# Altium footprint library Discretes.PcbLib: 81 footprints (part 3 of 6)
Each footprint in its own frame and in the unit in brackets; x right, y up, seen from the top. Pads: shape width x height; smd on the part's side, far side on the other; paste and mask are expansions set on the pad; w line width, h text height; cw(c..) or ccw(c..) is an arc to the next point about the centre after c.
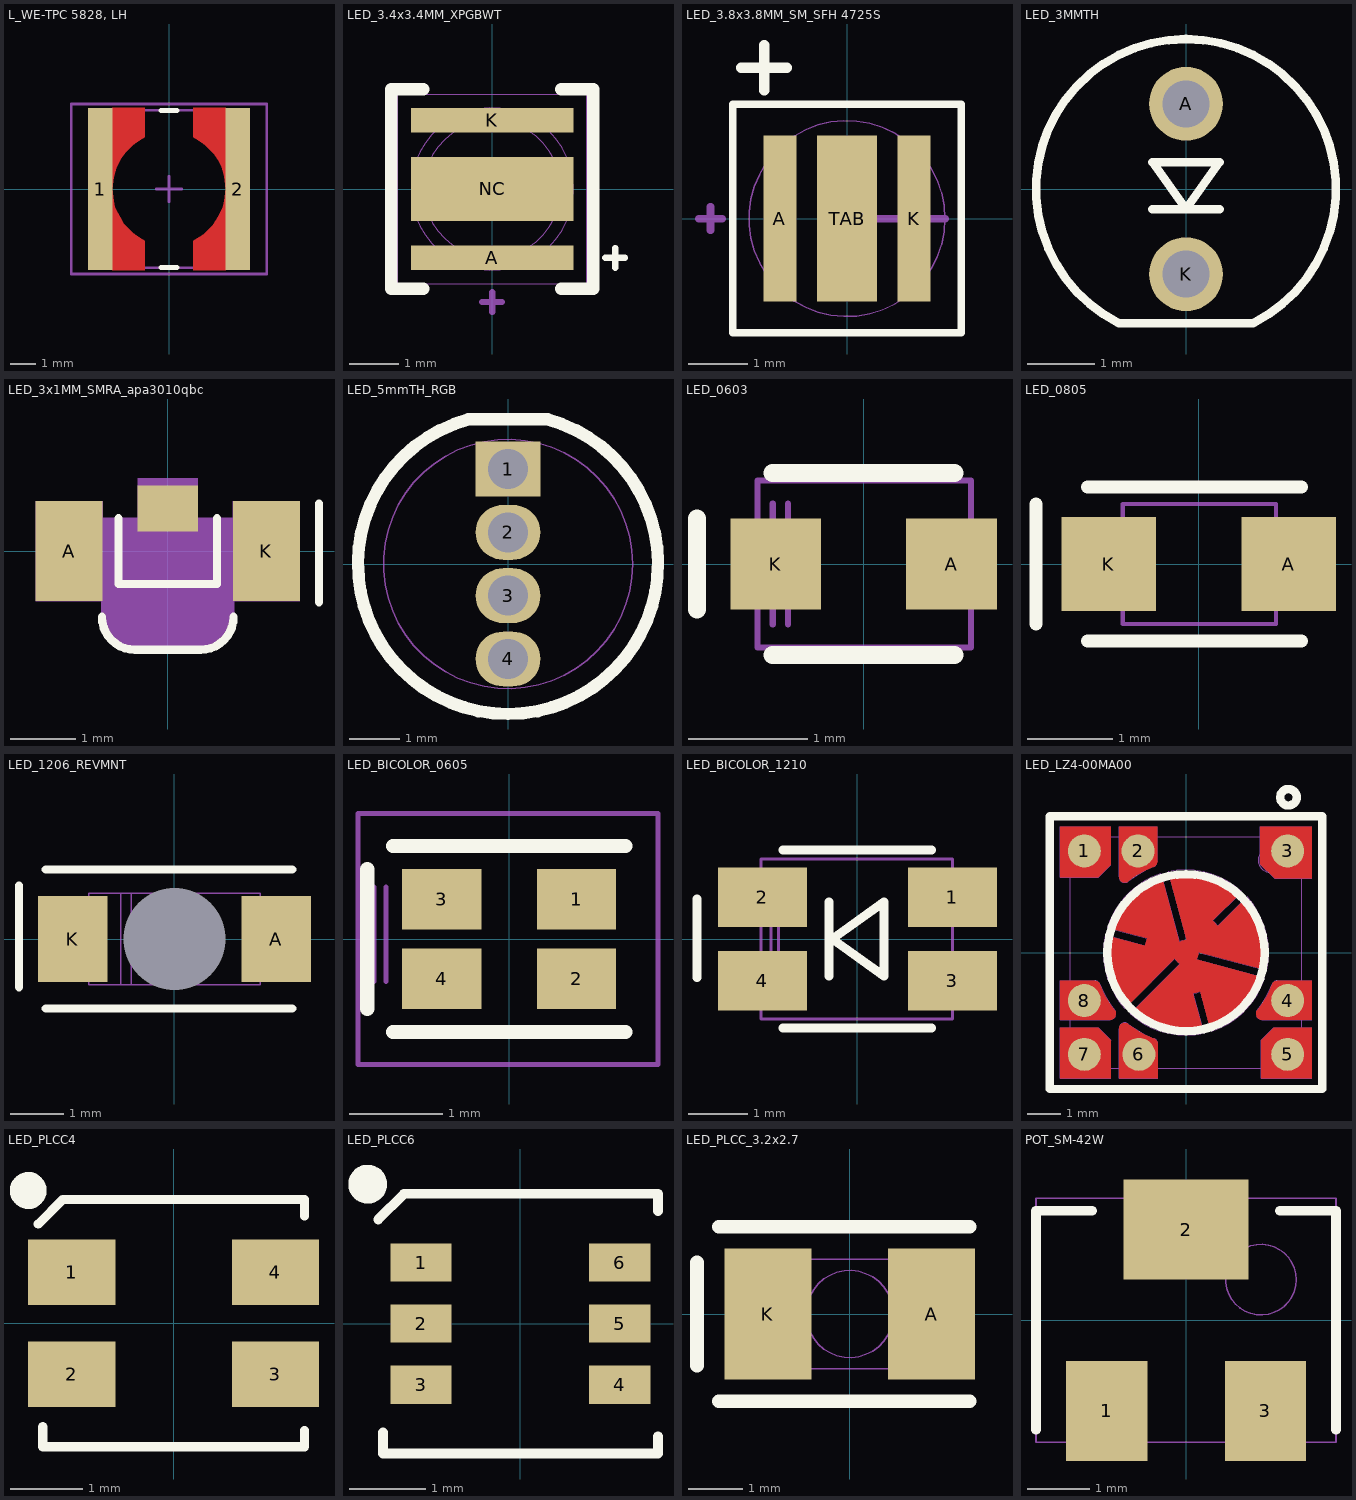
[diagram p2: the footprints below, top view; thin cyan lines are the x and y axes]

## L_WE-TPC 5828, LH [mm] "SMD Inductor, 2-Leads, Body 5,8x5,8mm"
height 3
pads (2):
  rect 0.95x6.3 smd: 1(-2.675,0) 2(2.675,0)
Top Layer:
  region: -2.2,3.15 -0.95,3.15 -0.95,2 -1.2,1.85 -1.4,1.7 -1.7,1.4 -1.85,1.2 -2.05,0.8 -2.15,0.45 -2.2,0
  region: 2.2,3.15 0.95,3.15 0.95,2 1.2,1.85 1.4,1.7 1.75,1.35 1.95,1.05 2.05,0.85 2.15,0.5 2.2,0
  region: 2.2,-3.15 0.95,-3.15 0.95,-2 1.35,-1.75 1.6,-1.5 1.7,-1.4 1.9,-1.1 2.05,-0.8 2.1,-0.65 2.15,-0.45 2.2,0
  region: -2.2,-3.15 -0.95,-3.15 -0.95,-2 -1.2,-1.85 -1.4,-1.7 -1.75,-1.35 -1.9,-1.1 -2.1,-0.7 -2.15,-0.45 -2.2,0
Top Overlay:
  lines w0.2: -0.3,-3.05 0.3,-3.05 ; -0.3,3.05 0.3,3.05
Mechanical 1:
  text ".Designator" at -1,-0.3 h1
Mechanical 13:
  lines w0.1: -3.05,-3.05 -3.05,3.05 3.05,3.05 3.05,-3.05 -3.05,-3.05
Mechanical 15:
  lines w0.1: -0.5,0 0.5,0 ; 0,-0.5 0,0.5 ; -3.8,-3.3 -3.8,3.3 3.8,3.3 3.8,-3.3 -3.8,-3.3
3D body "744053680.stp": height 2.79, standoff -0.01, extent -2.9,-2.9 2.9,2.9

## LED_3.4x3.4MM_XPGBWT [mm] "Cree Xlamp XPG2 Series LED footprint"
height 2.36
pads (3):
  rect 3.3x0.5 smd: A(0,-1.4) K(0,1.4)
  rect 3.3x1.3 smd: NC(0,0)
Top Overlay:
  lines w0.127: 2.3,-1.4 2.7,-1.4 ; 2.5,-1.6 2.5,-1.2
  lines w0.254: -1.4,-2.032 -2.057,-2.032 -2.057,2.032 -1.4,2.032 ; 1.4,-2.032 2.057,-2.032 2.057,2.032 1.4,2.032
Mechanical 1:
  circle w0.025: c0,0 r1.651
  circle w0.025: c0,0 r1.397
  lines w0.025: 1.925,1.925 -1.925,1.925 -1.925,-1.925 -1.925,-1.925 1.925,-1.925 1.925,-1.925 1.925,1.925 ; 1.925,1.925 1.925,1.925
  lines w0.127: -0.2,-2.3 0.2,-2.3 ; 0,-2.5 0,-2.1
  text ".Designator" at -1.9,2.2 h1
3D body "XLamp_XPG2_3D_STEP.stp": height 2.36, standoff 0, extent -1.725,-1.725 1.725,1.725

## LED_3.8x3.8MM_SM_SFH 4725S [mil] "Oslon 9401nm IR LED"
height 100
pads (3):
  rect 22x110 smd: A(-44.5,0) K(44.5,0)
  rect 40x110 smd: TAB(0,0)
Top Overlay:
  lines w5: 75.8,75.8 -75.78,75.8 -75.79,-75.77 75.77,-75.77 75.79,-75.79 75.79,75.79 ; 75.79,75.79 75.8,75.8
  lines w7: -70,100 -40,100 ; -55,85 -55,115
Top Paste:
  pour cut-out: 17,-6 -17,-6 -17,-51 17,-51
  pour cut-out: -37,51 -52.5,51 -52.5,-51 -37,-51
  pour cut-out: 37,-51 52.5,-51 52.5,51 37,51
  pour cut-out: -17,6 17,6 17,51 -17,51
Mechanical 1:
  circle w1: c0,0 r65
  circle w5: c0,0 r10
  lines w1: 75.78,75.8 -75.78,75.8 -75.79,-75.77 -75.78,-75.78 75.78,-75.78 75.79,-75.77 75.79,75.79 ; 75.78,75.8 75.79,75.79
  lines w5: -98.43,0 -82.68,0 ; -90.55,-7.87 -90.55,7.87 ; 10,0 65,0
  text ".Designator" at -45,15 h35
3D body "OslonSFH4725.step": height 94.53, standoff 0, extent -75.78,-75.78 75.8,75.8

## LED_3MMTH [mm] "LED, 3MM TH"
height 1.1
pads (2):
  round 1.1 hole 0.7: A(0,1.27) K(0,-1.27)
Top Overlay:
  lines w0.127: -0.5,-0.3 0.5,-0.3 ; -1,-2 cw(c0,0) 1,-2 -1,-2 ; -0.5,0.4 0.5,0.4 0,-0.3 -0.5,0.4
Mechanical 1:
  text ".Designator" at -0.6,2.7 h1.5

## LED_3x1MM_SMRA_apa3010qbc [mil] "LED right angle"
height 40
pads (3):
  rect 36x27.56 smd: " "(0,25.59)
  rect 40x60 smd: A(-59.06,0) K(59.05,0)
Top Overlay:
  lines w5: -39.37,-39.37 ccw(c-19.69,-39.37) -19.69,-59.06 19.68,-59.06 ccw(c19.68,-39.37) 39.37,-39.37 ; -29.53,19.68 -29.53,-19.69 29.52,-19.69 29.52,19.68 ; 90.55,-30.52 90.55,28.54
Mechanical 1:
  pour cut-out: -4.92,-29.53 -4.92,-19.69 4.92,-19.69 4.92,-29.53
  lines w1: -39.37,-19.69 -39.37,-39.37 ccw(c-19.69,-39.37) -19.69,-59.06 19.68,-59.06 ccw(c19.68,-39.37) 39.37,-39.37 39.37,-19.69 ; -59.06,-19.69 -59.06,19.68 59.05,19.68 59.05,-19.69 -59.06,-19.69
  text ".Designator" at -35.43,51.18 h39.37
Mechanical 11:
  pour cut-out: 18.03,19.68 38.89,19.68 38.89,30 79.05,30 79.05,-30 39.37,-30 39.37,-39.57 39.28,-41.28 39.04,-42.98 38.66,-44.65 38.13,-46.28 37.46,-47.86 36.66,-49.37 35.72,-50.81 34.67,-52.16 33.5,-53.42 32.23,-54.56 30.86,-55.6 29.41,-56.51 27.88,-57.29 26.29,-57.93 24.65,-58.43 22.98,-58.79 21.28,-59 19.72,-59.06 -19.92,-59.06 -21.63,-58.98 -23.32,-58.74 -24.98,-58.36 -26.61,-57.84 -28.18,-57.18 -29.69,-56.38 -31.13,-55.45 -32.47,-54.41 -33.73,-53.25 -34.87,-51.98 -35.9,-50.62 -36.81,-49.17 -37.59,-47.65 -38.23,-46.07 -38.74,-44.44 -39.1,-42.77 -39.31,-41.08 -39.37,-39.49 -39.37,-30 -79.06,-30 -79.06,30 -38.9,30 -38.9,19.68 -18.03,19.68 -18.03,43.62 18.03,43.62
3D body "90deg led.STEP": height 39.37, standoff 0, extent -59.05,-59.05 59.06,19.69

## LED_5mmTH_RGB [mm] "LED RGB, 5mm, Round, Through Hole"
height 1.1
pads (4):
  rect 1.3x1.1 hole 0.8: 1(0,1.905)
  oval 1.3x1.1 hole 0.8: 2(0,0.635) 3(0,-0.635) 4(0,-1.905)
Top Overlay:
  lines w0.25: -0.8,2.9 ccw(c0,0) 0.8,2.9 -0.8,2.9
Mechanical 1:
  circle w0.025: c0,0 r2.5
  circle w0.025: c0,0 r2.95
  text ".Designator" at -1.1,3.4 h1.5

## LED_0603 [mil] "LED Footprint 0603"
height 29.53
pads (2):
  rect 30x30 smd: A(29,0) K(-29,0)
Top Overlay:
  lines w6: -55,-15 -55,15 ; -30,-30 30,-30 ; -30,30 30,30
Mechanical 1:
  lines w2: -30,-20 -30,20 ; -25,-20 -25,20 ; 35.43,-27.56 -35,-27.56 -35,27.56 35.43,27.56
  lines w2.01: 35.43,-27.56 35.43,27.56
  text ".Designator" at -27.56,35.43 h39.37
3D body "APT1608.STEP": height 29.53, standoff 0, extent -31.88,-15.74 31.54,15.75

## LED_0805 [mm] "LED Footprint 0805"
height 0.75
pads (2):
  rect 1.1x1.1 smd: A(1.05,0) K(-1.05,0)
Top Overlay:
  lines w0.152: -1.9,-0.7 -1.9,0.7 ; -1.3,-0.9 1.2,-0.9 ; -1.3,0.9 1.2,0.9
Mechanical 1:
  lines w0.051: -0.762,-0.508 -0.762,0.508 ; -0.635,-0.508 -0.635,0.508 ; -0.889,-0.7 0.9,-0.7 0.9,0.7 -0.889,0.7 -0.889,-0.7
  text ".Designator" at -0.4,3.175 h1
3D body "LED SMD0805.step": height 0.85, standoff 0.01, extent -1.031,-0.453 1.031,0.453

## LED_1206_REVMNT [mm] "LED Footprint 1206 Reverse Mount"
height 1.1
pads (3):
  round 0 hole 1.9 unplated: 1(0,0)
  rect 1.3x1.6 smd: A(1.9,0) K(-1.9,0)
Top Overlay:
  lines w0.152: -2.9,-0.9 -2.9,1 ; -2.4,-1.3 2.2,-1.3 ; -2.4,1.3 2.2,1.3
Mechanical 1:
  lines w0.025: -1,0.85 -1,-0.85 -0.8,-0.85 -0.8,0.85 ; -1.6,-0.85 -1.6,0.85 1.6,0.85 1.6,-0.85 -1.6,-0.85
  text ".Designator" at -1.325,1.5 h1.52

## LED_BICOLOR_0605 [mm] "LED Footprint bi-color 0605"
height 0.75
pads (4):
  rect 0.85x0.65 smd mask+0.06: 1(0.725,0.425) 2(0.725,-0.425) 3(-0.725,0.425) 4(-0.725,-0.425)
Top Overlay:
  lines w0.152: -1.525,-0.75 -1.525,0.75 ; -1.25,-1 1.25,-1 ; -1.25,1 1.25,1
Mechanical 1:
  lines w0.051: -1.452,-0.458 -1.452,0.558 ; -1.325,-0.458 -1.325,0.558 ; -1.625,-1.35 -1.625,1.35 1.6,1.35 1.6,-1.35 -1.625,-1.35
  text ".Designator" at -0.4,3.175 h1

## LED_BICOLOR_1210 [mm] "LED Footprint bi-color 1210 style"
height 0.75
pads (4):
  rect 1.5x1 smd: 1(1.6,0.7) 2(-1.6,0.7) 3(1.6,-0.7) 4(-1.6,-0.7)
Top Overlay:
  lines w0.152: -2.7,-0.65 -2.7,0.675 ; -1.25,-1.5 1.25,-1.5 ; -1.25,1.5 1.25,1.5 ; -0.475,-0.625 -0.475,0.625 ; -0.425,0 0.45,-0.625 0.45,0 0.45,0.625 -0.425,0
Mechanical 1:
  lines w0.051: -1.452,-0.458 -1.452,0.558 ; -1.325,-0.458 -1.325,0.558 ; -1.625,-1.35 -1.625,1.35 1.6,1.35 1.6,-1.35 -1.625,-1.35
  text ".Designator" at -0.4,3.175 h1
3D body "APB3227.STEP": height 1.1, standoff 0, extent -1.6,-1.35 1.6,1.35

## LED_LZ4-00MA00 [mm]
height 4.2
pads (8):
  round 1 smd paste-1 mask+0: 1(-3.075,3.075) 2(-1.45,3.075) 3(3.075,3.075) 4(3.075,-1.45) 5(3.075,-3.075) 6(-1.425,-3.075) 7(-3.075,-3.075) 8(-3.075,-1.45)
Top Layer:
  region: 2.275,-3.8 3.8,-3.8 3.8,-2.275 2.654,-2.275 2.275,-2.654
  region: 2.679,2.25 2.25,2.679 2.25,3.8 3.8,3.8 3.8,2.25
  region: -3.8,2.275 -2.654,2.275 -2.275,2.654 -2.275,3.8 -3.8,3.8
  region: -3.8,-3.8 -2.275,-3.8 -2.275,-2.654 -2.654,-2.275 -3.8,-2.275
  region: -1.753,-1.591 -0.333,-0.172 -0.32,-0.197 -0.286,-0.245 -0.245,-0.286 -0.197,-0.32 -0.172,-0.333 -1.591,-1.753 -1.487,-1.848 -1.258,-2.012 -1.011,-2.147 -0.749,-2.252 -0.477,-2.325 -0.198,-2.365 0.083,-2.372 0.364,-2.344 0.502,-2.314 0.212,-1.232 0.24,-1.227 0.296,-1.215 0.351,-1.2 0.406,-1.183 0.433,-1.173 0.723,-2.255 0.857,-2.212 1.114,-2.096 1.354,-1.949 1.576,-1.775 1.775,-1.576 1.949,-1.354 2.096,-1.113 2.212,-0.857 2.255,-0.723 0.315,-0.203 0.331,-0.179 0.355,-0.125 0.37,-0.069 0.376,-0.011 0.375,0.018 2.314,-0.502 2.344,-0.364 2.372,-0.083 2.365,0.198 2.325,0.477 2.252,0.749 2.147,1.011 2.012,1.258 1.848,1.487 1.753,1.591 0.961,0.799 0.943,0.821 0.904,0.864 0.864,0.904 0.821,0.943 0.799,0.961 1.563,1.725 1.46,1.818 1.236,1.978 0.993,2.111 0.736,2.214 0.469,2.286 0.196,2.325 -0.081,2.331 -0.356,2.304 -0.491,2.275 0.018,0.375 -0.011,0.376 -0.069,0.37 -0.125,0.355 -0.179,0.331 -0.203,0.315 -0.723,2.255 -0.857,2.212 -1.114,2.096 -1.354,1.949 -1.576,1.775 -1.775,1.576 -1.949,1.354 -2.096,1.113 -2.212,0.857 -2.255,0.723 -1.173,0.433 -1.183,0.406 -1.2,0.351 -1.215,0.296 -1.227,0.24 -1.232,0.212 -2.314,0.502 -2.344,0.364 -2.372,0.083 -2.365,-0.198 -2.325,-0.477 -2.252,-0.749 -2.147,-1.011 -2.012,-1.258 -1.848,-1.487
  region: -3.8,-2.025 -3.8,-0.85 -2.766,-0.85 -2.739,-0.85 -2.688,-0.866 -2.644,-0.897 -2.611,-0.939 -2.602,-0.964 -2.561,-1.068 -2.467,-1.272 -2.356,-1.466 -2.23,-1.652 -2.162,-1.74 -2.13,-1.78 -2.118,-1.88 -2.162,-1.971 -2.247,-2.025 -2.298,-2.025
  region: -2.025,-3.8 -0.85,-3.8 -0.85,-2.766 -0.85,-2.739 -0.866,-2.688 -0.897,-2.644 -0.939,-2.611 -0.964,-2.602 -1.068,-2.561 -1.272,-2.467 -1.466,-2.356 -1.652,-2.23 -1.74,-2.162 -1.78,-2.13 -1.88,-2.118 -1.971,-2.162 -2.025,-2.247 -2.025,-2.298
  region: 2.298,-2.025 2.247,-2.025 2.162,-1.971 2.118,-1.88 2.13,-1.78 2.162,-1.74 2.23,-1.652 2.356,-1.466 2.467,-1.272 2.561,-1.068 2.602,-0.964 2.611,-0.939 2.644,-0.897 2.688,-0.866 2.739,-0.85 2.766,-0.85 3.8,-0.85 3.8,-2.025
  region: -2.025,2.298 -2.025,2.247 -1.971,2.162 -1.88,2.118 -1.78,2.13 -1.74,2.162 -1.654,2.228 -1.474,2.351 -1.285,2.459 -1.089,2.553 -0.988,2.593 -0.963,2.603 -0.921,2.636 -0.891,2.679 -0.875,2.73 -0.875,2.757 -0.875,3.8 -2.025,3.8
Top Overlay:
  circle w0.254: c3.099,4.699 r0.25
  circle w0.254: c0,0 r2.376
  lines w0.254: -4.125,-4.125 4.125,-4.125 4.125,4.125 -4.125,4.125 -4.125,-4.125
Top Paste:
  region: 0,-2.35 -0.231,-2.35 -0.685,-2.26 -1.113,-2.083 -1.498,-1.825 -1.825,-1.498 -2.083,-1.113 -2.26,-0.685 -2.35,-0.231 -2.35,0 -2.35,0.231 -2.26,0.685 -2.083,1.113 -1.825,1.498 -1.498,1.825 -1.113,2.083 -0.685,2.26 -0.231,2.35 0,2.35 0.231,2.35 0.685,2.26 1.113,2.083 1.498,1.825 1.825,1.498 2.083,1.113 2.26,0.685 2.35,0.231 2.35,0 2.35,-0.231 2.26,-0.685 2.083,-1.113 1.825,-1.498 1.498,-1.825 1.113,-2.083 0.685,-2.26 0.231,-2.35
Top Solder:
  region: 0,-2.45 -0.241,-2.45 -0.715,-2.356 -1.161,-2.171 -1.562,-1.903 -1.903,-1.562 -2.171,-1.161 -2.356,-0.715 -2.45,-0.241 -2.45,0 -2.45,0.241 -2.356,0.715 -2.171,1.161 -1.903,1.562 -1.562,1.903 -1.161,2.171 -0.715,2.356 -0.241,2.45 0,2.45 0.241,2.45 0.715,2.356 1.161,2.171 1.562,1.903 1.903,1.562 2.171,1.161 2.356,0.715 2.45,0.241 2.45,0 2.45,-0.241 2.356,-0.715 2.171,-1.161 1.903,-1.562 1.562,-1.903 1.161,-2.171 0.715,-2.356 0.241,-2.45
Mechanical 1:
  circle w0.025: c2.54,2.794 r0.359
  lines w0.025: -3.5,-3.5 -3.5,3.5 3.5,3.5 3.5,-3.5 -3.5,-3.5
  text ".Designator" at -2.667,4.445 h1.52
Mechanical 32:
  lines w0.013: -3.8,-3.8 -3.8,-2.275 -2.654,-2.275 -2.275,-2.654 -2.275,-3.8 -3.8,-3.8 ; -3.8,-2.025 -3.8,-0.85 -2.766,-0.85 cw(c-2.766,-1.025) -2.602,-0.964 ccw(c0,0) -2.162,-1.74 cw(c-2.298,-1.85) -2.298,-2.025 -3.8,-2.025 ; -3.8,2.275 -3.8,3.8 -2.275,3.8 -2.275,2.654 -2.654,2.275 -3.8,2.275 ; -2.442,0.536 ccw(c0,0) -1.847,-1.685 -0.333,-0.172 ccw(c0,0) -0.172,-0.333 -1.685,-1.847 ccw(c0,0) 0.536,-2.442 0.212,-1.232 ccw(c0,0) 0.433,-1.173 0.757,-2.383 ccw(c0,0) 2.383,-0.757 0.315,-0.203 ccw(c0,0) 0.375,0.018 2.442,-0.536 ccw(c0,0) 1.847,1.685 0.961,0.799 ccw(c0,0) 0.799,0.961 1.685,1.847 ccw(c0,0) -0.536,2.442 0.018,0.375 ccw(c0,0) -0.203,0.315 -0.757,2.383 ccw(c0,0) -2.383,0.757 -1.173,0.433 ccw(c0,0) -1.232,0.212 -2.442,0.536 ; -2.025,-3.8 -0.85,-3.8 -0.85,-2.766 ccw(c-1.025,-2.766) -0.964,-2.602 cw(c0,0) -1.74,-2.162 ccw(c-1.85,-2.298) -2.025,-2.298 -2.025,-3.8 ; -2.025,2.298 ccw(c-1.85,2.298) -1.74,2.162 cw(c0,0) -0.988,2.593 ccw(c-1.05,2.757) -0.875,2.757 -0.875,3.8 -2.025,3.8 -2.025,2.298 ; 2.162,-1.74 ccw(c2.298,-1.85) 2.298,-2.025 3.8,-2.025 3.8,-0.85 2.766,-0.85 ccw(c2.766,-1.025) 2.602,-0.964 cw(c0,0) 2.162,-1.74 ; 2.25,2.679 2.679,2.25 3.8,2.25 3.8,3.8 2.25,3.8 2.25,2.679 ; 2.275,-3.8 3.8,-3.8 3.8,-2.275 2.654,-2.275 2.275,-2.654 2.275,-3.8
3D body "LZ4-0XXX-0707-P3_10W-Emitter_PART_RevC2.STEP": height 4.15, standoff 0, extent -3.5,-3.5 3.5,3.5

## LED_PLCC4 [mm] "Cree LED PLCC4 tri color LED"
height 2.36
pads (4):
  rect 1.2x0.9 smd: 1(-1.4,0.7) 2(-1.4,-0.7) 3(1.4,-0.7) 4(1.4,0.7)
Top Overlay:
  circle w0.254: c-2,1.825 r0.127
  lines w0.127: -1.862,1.363 -1.525,1.7 1.8,1.7 1.8,1.475 ; -1.8,-1.425 -1.8,-1.7 1.8,-1.7 1.8,-1.475
3D body "PLCC4.STEP": height 2, standoff 0, extent -1.8,-1.7 1.8,1.7

## LED_PLCC6 [mm] "Cree LED PLCC6 tri color LED"
height 2.36
pads (6):
  rect 0.8x0.5 smd: 1(-1.3,0.8) 2(-1.3,0) 3(-1.3,-0.8) 4(1.3,-0.8) 5(1.3,0) 6(1.3,0.8)
Top Overlay:
  circle w0.254: c-2,1.825 r0.127
  lines w0.127: -1.862,1.363 -1.525,1.7 1.8,1.7 1.8,1.475 ; -1.8,-1.425 -1.8,-1.7 1.8,-1.7 1.8,-1.475
3D body: height 0.8, standoff 0, extent -1.4,-1.4 1.4,1.4
3D body: height 2.3, standoff 0.8, extent -1.35,-1.35 1.35,1.35
3D body: height 2.5, standoff 2.3, extent -1.35,-1.35 1.35,1.35

## LED_PLCC_3.2x2.7 [mm] "LED Footprint PLCC 3.2x2.7"
height 1.1
pads (2):
  rect 1.6x2.4 smd: A(1.5,0) K(-1.5,0)
Top Overlay:
  lines w0.254: -2.8,-0.95 -2.8,0.95 ; -2.4,-1.6 2.2,-1.6 ; -2.4,1.6 2.2,1.6
Mechanical 1:
  circle w0.025: c0,0 r0.8
  lines w0.025: -1.5,0.3 -0.8,1 ; -0.8,1 -0.8,1 ; -1.5,-1 -1.5,1 1.5,1 1.5,-1 -1.5,-1
  text ".Designator" at 0.5,1.1 h1.5
  text "+" at 1.7,-0.8 h1.5
3D body "PLCC2-3_0x2_0.step": height 1.3, standoff 0, extent -1.5,-1 1.5,1

## POT_SM-42W [mm] "Potentiometer Copal SM-42"
height 5.3
pads (3):
  rect 1.3x1.6 smd: 1(-1.27,-1.45) 3(1.27,-1.45)
  rect 2x1.6 smd: 2(0,1.45)
Top Overlay:
  lines w0.152: -2.4,-1.75 -2.4,1.75 -1.5,1.75 ; 1.5,1.75 2.4,1.75 2.4,-1.75
Mechanical 1:
  circle w0.025: c1.2,0.65 r0.565
  lines w0.025: -2.4,-1.95 2.4,-1.95 2.4,1.95 -2.4,1.95 -2.4,-1.95
  text ".Designator" at -2.032,2.413 h0.79
3D body "SM-42TW10_(100).stp": height 5.25, standoff -0.05, extent -2.4,-1.95 2.4,1.95